# Altium footprint library lib_eps.PcbLib: 113 footprints (part 6 of 8)
Each footprint in its own frame and in the unit in brackets; x right, y up, seen from the top. Pads: shape width x height; smd on the part's side, far side on the other; paste and mask are expansions set on the pad; w line width, h text height; cw(c..) or ccw(c..) is an arc to the next point about the centre after c.
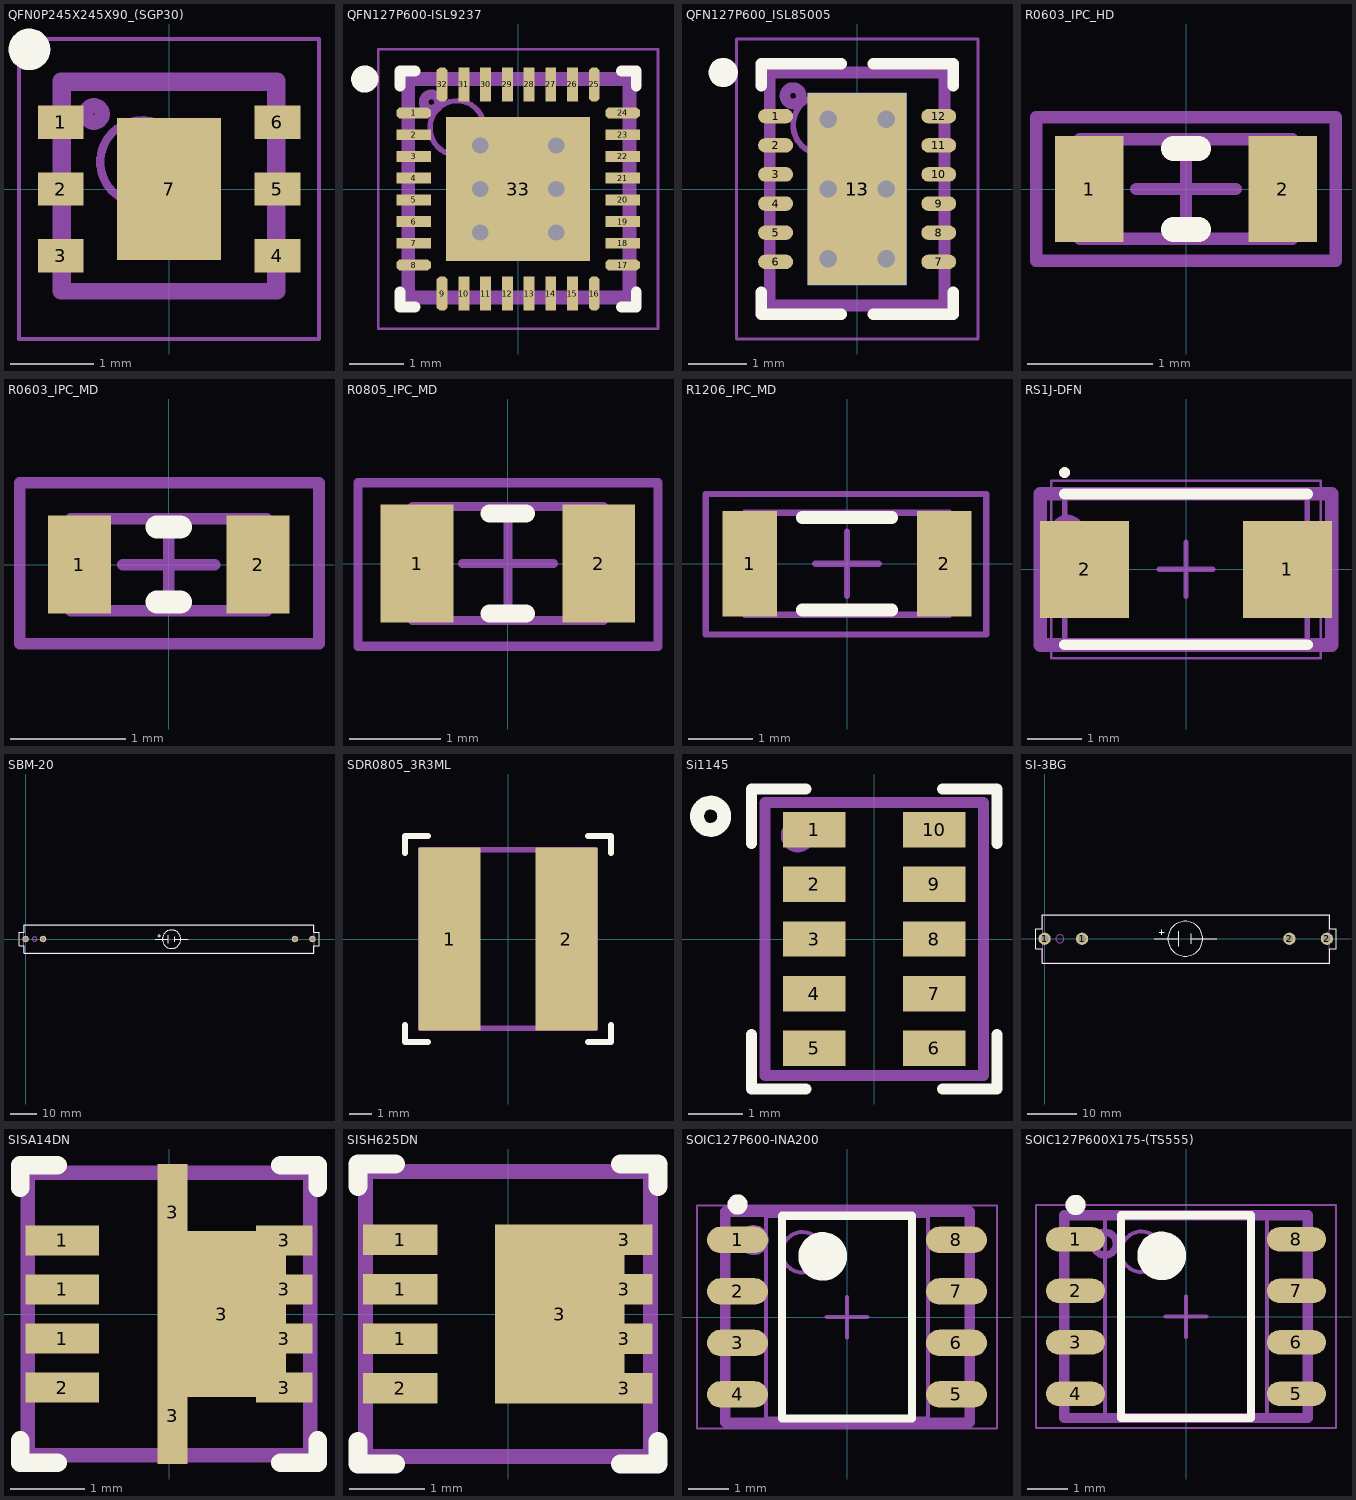
[diagram p5: the footprints below, top view; thin cyan lines are the x and y axes]

## QFN0P245X245X90_(SGP30) [mm] "QFN, 6-Leads, Body 2,45x2,45mm, Pitch 0,00mm/0,80mm, Thermal Pad 1,25x1,70mm, IPC Medium Density"
height 0.9
pads (7):
  rect 0.55x0.4 smd: 1(-1.3,0.8) 2(-1.3,0) 3(-1.3,-0.8) 4(1.3,-0.8) 5(1.3,0) 6(1.3,0.8)
  rect 1.25x1.7 smd: 7(0,0)
Top Overlay:
  circle w0.25: c-1.675,1.675 r0.125
Mechanical 13:
  circle w0.1: c-0.325,0.325 r0.5
  lines w0.1: -1.225,-1.225 -1.225,1.225 1.225,1.225 1.225,-1.225 -1.225,-1.225
Mechanical 15:
  lines w0.05: -1.8,-1.8 -1.8,1.8 1.8,1.8 1.8,-1.8 -1.8,-1.8
  lines w0.1: -0.5,0 0.5,0 ; 0,-0.5 0,0.5
Mechanical 29:
  circle w0.18: c-0.9,0.9 r0.1
  lines w0.2: -1.3,-1.225 -1.3,1.3 1.3,1.3 1.3,-1.225 -1.3,-1.225
  text "'.Designator'" at -0.9,-0.2 h0.6
3D body "QFN0P245X245X90_(SGP30).step": height 0.9, standoff 0, extent -1.235,-1.225 1.235,1.225

## QFN127P600-ISL9237 [mm]
height 0.9
pads (33):
  oct 0.63x0.2 smd mask+0.051: 1(-1.925,1.4) 8(-1.925,-1.4) 17(1.925,-1.4) 24(1.925,1.4)
  rect 0.63x0.2 smd mask+0.051: 2(-1.925,1) 3(-1.925,0.6) 4(-1.925,0.2) 5(-1.925,-0.2) 6(-1.925,-0.6) 7(-1.925,-1) 18(1.925,-1) 19(1.925,-0.6) 20(1.925,-0.2) 21(1.925,0.2) 22(1.925,0.6) 23(1.925,1)
  oct 0.2x0.63 smd mask+0.051: 9(-1.4,-1.925) 16(1.4,-1.925) 25(1.4,1.925) 32(-1.4,1.925)
  rect 0.2x0.63 smd mask+0.051: 10(-1,-1.925) 11(-0.6,-1.925) 12(-0.2,-1.925) 13(0.2,-1.925) 14(0.6,-1.925) 15(1,-1.925) 26(1,1.925) 27(0.6,1.925) 28(0.2,1.925) 29(-0.2,1.925) 30(-0.6,1.925) 31(-1,1.925)
  rect 2.65x2.65 smd mask+0.051: 33(0,0)
via 0.7,-0.8 diameter 0.605 hole 0.3
via -0.7,-0.8 diameter 0.605 hole 0.3
via 0.7,0 diameter 0.605 hole 0.3
via -0.7,0 diameter 0.605 hole 0.3
via 0.7,0.8 diameter 0.605 hole 0.3
via -0.7,0.8 diameter 0.605 hole 0.3
Top Overlay:
  circle w0.25: c-2.825,2.025 r0.125
  lines w0.2: -2.175,-1.9 -2.175,-2.175 -1.9,-2.175 ; -2.175,1.9 -2.175,2.175 -1.9,2.175 ; 1.9,-2.175 2.175,-2.175 2.175,-1.9 ; 1.9,2.175 2.175,2.175 2.175,1.9
Mechanical 13:
  circle w0.1: c-1.125,1.125 r0.5
  lines w0.1: -2.025,-2.025 -2.025,2.025 2.025,2.025 2.025,-2.025 -2.025,-2.025
Mechanical 15:
  lines w0.05: -2.575,-2.575 -2.575,2.575 2.575,2.575 2.575,-2.575 -2.575,-2.575
  lines w0.1: -0.5,0 0.5,0 ; 0,-0.5 0,0.5
Mechanical 29:
  circle w0.18: c-1.6,1.6 r0.141
  lines w0.254: -2.025,-2 -2.025,2.025 2.05,2.025 2.05,-2 -2.025,-2
  text "'.Designator'" at -1.5,-0.2 h0.6
3D body "QFN127P600-ISL9237.step": height 0.9, standoff 0, extent -2.075,-2.075 2.075,2.075

## QFN127P600_ISL85005 [mm]
height 0.9
pads (14):
  oval 0.6x0.25 smd mask+0.051: 1(-1.4,1.25) 2(-1.4,0.75) 3(-1.4,0.25) 4(-1.4,-0.25) 5(-1.4,-0.75) 6(-1.4,-1.25) 7(1.4,-1.25) 8(1.4,-0.75) 9(1.4,-0.25) 10(1.4,0.25) 11(1.4,0.75) 12(1.4,1.25)
  rect 1.7x3.3 smd mask+0.051: 13(0,0)
  rect 1.7x3.3 smd far side: 13(0,0)
via 0.5,-1.2 diameter 0.605 hole 0.3
via -0.5,-1.2 diameter 0.605 hole 0.3
via -0.5,0 diameter 0.605 hole 0.3
via 0.5,1.2 diameter 0.605 hole 0.3
via -0.5,1.2 diameter 0.605 hole 0.3
via 0.5,0 diameter 0.605 hole 0.3
Top Overlay:
  circle w0.25: c-2.3,2 r0.125
  lines w0.2: -1.65,-1.775 -1.65,-2.15 -0.275,-2.15 ; -1.65,1.775 -1.65,2.15 -0.275,2.15 ; 0.275,-2.15 1.65,-2.15 1.65,-1.775 ; 0.275,2.15 1.65,2.15 1.65,1.775
Mechanical 13:
  circle w0.1: c-0.6,1.1 r0.5
  lines w0.1: -1.5,-2 -1.5,2 1.5,2 1.5,-2 -1.5,-2
Mechanical 15:
  lines w0.05: -2.075,-2.575 -2.075,2.575 2.075,2.575 2.075,-2.575 -2.075,-2.575
  lines w0.1: -0.5,0 0.5,0 ; 0,-0.5 0,0.5
Mechanical 29:
  circle w0.18: c-1.1,1.6 r0.141
  lines w0.2: -1.5,-2 1.5,-2 1.5,2 -1.5,2 -1.5,-2
  text "'.Designator'" at -1,-0.3 h0.6
3D body "QFN127P600-8N.step": height 0.9, standoff 0, extent -1.55,-2 1.55,2

## R0603_IPC_HD [mm] "Chip Resistor, 2-Leads, Body 1,60x0,80mm, IPC Medium Density"
height 0.45
pads (2):
  rect 0.55x0.85 smd: 1(-0.775,0) 2(0.775,0)
Top Overlay:
  lines w0.2: -0.1,-0.325 0.1,-0.325 ; -0.1,0.325 0.1,0.325
Mechanical 13:
  lines w0.1: -0.85,-0.4 -0.85,0.4 0.85,0.4 0.85,-0.4 -0.85,-0.4
Mechanical 15:
  lines w0.05: -1.175,-0.55 -1.175,0.55 -1.15,0.55 1.175,0.55 1.175,-0.55 -1.175,-0.55
  lines w0.1: -0.4,0 0.4,0 ; 0,-0.4 0,0.4
Mechanical 29:
  lines w0.1: -1.2,-0.575 1.2,-0.575 1.2,0.575 -1.2,0.575 -1.2,-0.575
  text ".Designator" at -1.092,-0.254 h0.6
3D body "R0603_IPC_MD2.step": height 0.45, standoff 0, extent -0.85,-0.4 0.85,0.4

## R0603_IPC_MD [mm] "Chip Resistor, 2-Leads, Body 1,60x0,80mm, IPC Medium Density"
height 0.45
pads (2):
  rect 0.55x0.85 smd: 1(-0.775,0) 2(0.775,0)
Top Overlay:
  lines w0.2: -0.1,-0.325 0.1,-0.325 ; -0.1,0.325 0.1,0.325
Mechanical 13:
  lines w0.1: -0.85,-0.4 0.85,-0.4 0.85,0.4 -0.85,0.4 -0.85,-0.4
Mechanical 15:
  lines w0.05: -1.3,-0.7 1.3,-0.7 1.3,0.7 -1.3,0.7 -1.3,-0.7
  lines w0.1: -0.4,0 0.4,0 ; 0,-0.4 0,0.4
Mechanical 29:
  lines w0.1: -1.295,-0.689 -1.295,0.711 1.305,0.711 1.305,-0.689 -1.295,-0.689
  text ".Designator" at -1.092,-0.254 h0.6
3D body "R0603_IPC_MD2.step": height 0.45, standoff 0, extent -0.85,-0.4 0.85,0.4

## R0805_IPC_MD [mm] "Chip Resistor, 2-Leads, Body 2,00x1,25mm, IPC Medium Density"
height 0.5
pads (2):
  rect 0.8x1.3 smd: 1(-1,0) 2(1,0)
Top Overlay:
  lines w0.2: -0.2,-0.55 0.2,-0.55 ; -0.2,0.55 0.2,0.55
Mechanical 13:
  lines w0.1: -1.05,-0.625 1.05,-0.625 1.05,0.625 -1.05,0.625 -1.05,-0.625
Mechanical 15:
  lines w0.05: -1.65,-0.9 1.65,-0.9 1.65,0.9 -1.65,0.9 -1.65,-0.9
  lines w0.1: -0.5,0 0.5,0 ; 0,-0.5 0,0.5
Mechanical 29:
  lines w0.1: -1.649,-0.911 -1.649,0.889 1.651,0.889 1.651,-0.911 -1.649,-0.911
  text ".Designator" at -1.448,-0.381 h0.7
3D body "R0805_IPC_MD2.step": height 0.5, standoff 0, extent -1.05,-0.625 1.05,0.625

## R1206_IPC_MD [mm] "Chip Resistor, 2-Leads, Body 3,10x1,60mm, IPC Medium Density"
height 0.55
pads (2):
  rect 0.85x1.65 smd: 1(-1.525,0) 2(1.525,0)
Top Overlay:
  lines w0.2: -0.7,-0.725 0.7,-0.725 ; -0.7,0.725 0.7,0.725
Mechanical 13:
  lines w0.1: -1.6,-0.8 1.6,-0.8 1.6,0.8 -1.6,0.8 -1.6,-0.8
Mechanical 15:
  lines w0.05: -2.2,-1.1 2.2,-1.1 2.2,1.1 -2.2,1.1 -2.2,-1.1
  lines w0.1: -0.5,0 0.5,0 ; 0,-0.5 0,0.5
Mechanical 29:
  lines w0.1: -2.216,-1.108 -2.216,1.092 2.184,1.092 2.184,-1.108 -2.216,-1.108
  text ".Designator" at -1.854,-0.381 h0.8
3D body "R1206_IPC_MD.step": height 0.55, standoff 0, extent -1.6,-0.8 1.6,0.8

## RS1J-DFN [mm] "DFN, 2-Leads, Body 2,67x4,25mm, Pitch 3,76mm, IPC Medium Density"
height 2.29
pads (2):
  rect 1.65x1.8 smd: 1(1.88,0) 2(-1.88,0)
Top Overlay:
  circle w0.1: c-2.25,1.795 r0.05
  lines w0.2: -2.25,-1.395 2.25,-1.395 ; -2.25,1.395 2.25,1.395
Mechanical 13:
  lines w0.1: -2.25,-1.395 -2.25,1.395 2.25,1.395 2.25,-1.395 -2.25,-1.395
Mechanical 15:
  lines w0.05: -2.5,-1.645 -2.5,1.645 2.5,1.645 2.5,-1.645 -2.5,-1.645
  lines w0.1: -0.5,0 0.5,0 ; 0,-0.5 0,0.5
Mechanical 29:
  circle w0.18: c-2.2,0.7 r0.224
  lines w0.254: -2.7,-1.4 2.7,-1.4 2.7,1.4 -2.7,1.4 -2.7,-1.4
  text "'.Designator'" at -2,-0.2 h0.6
3D body "RS1J-DFN.step": height 2.29, standoff 0, extent -2.64,-1.395 2.64,1.395

## SBM-20 [mm] "Geiger tube 400V"
pads (4):
  round 2.5 hole 1.5: 1(0,0) 1(6.731,0) 2(103.269,0) 2(110,0)
Top Overlay:
  circle w0.254: c56,-0.1 r3.538
  lines w0.25: 49.7,-0.1 54.7,-0.1 54.7,1.4 54.7,-1.6 ; 51.25,0.75 51.25,1.75 51.25,1.25 50.75,1.25 51.75,1.25 ; 57.2,-1.1 57.2,0.9 ; 57.2,-0.1 62.4,-0.1 ; -2.5,-2.5 -0.5,-2.5 -0.5,-5.5 110.5,-5.5 110.5,-2.5 112.5,-2.5 112.5,2 112.5,2.5 110.5,2.5 110.5,5.5 -0.5,5.5 -0.5,2.5 -2.5,2.5 -2.5,-2.5
Mechanical 29:
  circle w0.18: c3.5,0 r0.86
  lines w0.254: -0.6,2.1 -0.6,5.3 -0.5,5.3 110.6,5.3 110.6,-5.3 -0.6,-5.3 -0.6,2.3
  text "'.Designator'" at 29,-1 h1.52
3D body "spm20.stp": height 15.42, standoff -1.09, extent -0.5,-5.323 110.549,5.323

## SDR0805_3R3ML [mm] "3.3µH Unshielded Wirewound Inductor 4.5A 20 mOhm Max Nonstandard"
pads (2):
  rect 2.7x8 smd: 1(-2.55,0) 2(2.55,0)
Top Overlay:
  lines w0.254: -4.5,-3.75 -4.5,-4.5 -3.5,-4.5 ; -4.5,3.75 -4.5,4.5 -3.5,4.5 ; 3.5,-4.5 4.5,-4.5 4.5,-3.75 ; 3.5,4.5 4.5,4.5 4.5,3.75
Mechanical 29:
  lines w0.254: -3.8,-3.9 0,-3.9 3.8,-3.9 3.8,3.9 -3.8,3.9 -3.8,-3.9
  text "'.Designator'" at -2.1,-0.2 h0.6
3D body "sdr0805.stp": height 5.3, standoff 0, extent -3.9,-3.9 3.9,3.9

## Si1145 [mm] "Optical Sensor Ambient, IR, Ultraviolet (UV) 850nm I?C 10-SMD Module, No Lead"
height 1.2
pads (10):
  rect 1.15x0.65 smd: 1(-1.1,2) 2(-1.1,1) 3(-1.1,0) 4(-1.1,-1) 5(-1.1,-2) 6(1.1,-2) 7(1.1,-1) 8(1.1,0) 9(1.1,1) 10(1.1,2)
Top Overlay:
  circle w0.254: c-3,2.25 r0.25
  lines w0.2: -2.25,-1.75 -2.25,-2.75 -1.25,-2.75 ; -1.25,2.75 -2.25,2.75 ; 1.25,-2.75 2.25,-2.75 2.25,-1.75 ; 1.25,2.75 2.25,2.75 2.25,1.75 ; -2.25,2.75 -2.25,1.75 -2.25,2.75
Mechanical 29:
  circle w0.18: c-1.4,1.9 r0.224
  lines w0.2: -2,-2.5 -2,2.5 2,2.5 2,-2.5 -2,-2.5
  text "'.Designator'" at -1.6,-0.1 h0.6
3D body "UV, Ambient Light Sensor.step": height 1.3, standoff -0.01, extent -2,-2.5 2,2.5

## SI-3BG [mm] "Geiger tube 400V"
pads (4):
  round 2.5 hole 1.5: 1(0,0) 1(7.62,0) 2(49.78,0) 2(57.4,0)
Top Overlay:
  circle w0.254: c28.6,0 r3.538
  lines w0.25: 22.3,0 27.3,0 27.3,1.5 27.3,-1.5 ; 23.85,0.85 23.85,1.85 23.85,1.35 23.35,1.35 24.35,1.35 ; 29.8,-1 29.8,1 ; 29.8,0 35,0
  lines w0.254: -1.75,-2 -1.75,2 -0.5,2 -0.5,4.9 58,4.9 58,2 59.25,2 59.25,-2 58,-2 58,-5 -0.5,-5 -0.5,-2 -1.75,-2
Mechanical 29:
  lines w0.18: 3.9,0.1 ccw(c3.1,0) 3.906,0
  lines w0.254: -0.4,-4.9 -0.4,4.8 57.9,4.8 57.9,-4.9 -0.4,-4.9
  text "'.Designator'" at 9.5,-0.7 h1.52
3D body "Сборка2.stp": height 13.26, standoff -2.75, extent -0.358,-4.913 57.847,4.761

## SISA14DN [mm] "PowerPAK® 1212-8  N-Channel 30V 20A"
pads (11):
  rect 0.99x0.405 smd mask+0.051: 1(-1.435,-0.33) 1(-1.435,0.33) 1(-1.435,0.99) 2(-1.435,-0.99)
  rect 0.4x1.3 smd mask+0.051: 3(0.047,1.368) 3(0.048,-1.368)
  rect 1.725x2.235 smd mask+0.051: 3(0.71,0)
  rect 0.76x0.405 smd mask+0.051: 3(1.55,-0.99) 3(1.55,-0.33) 3(1.55,0.33) 3(1.55,0.99)
Top Overlay:
  lines w0.25: -2,1.7 -2,2
  lines w0.254: -2,-1.7 -2,-2 -1.5,-2 ; -2,2 -1.75,2 -1.5,2 ; 1.5,-2 2,-2 2,-1.7 ; 1.5,2 2,2 2,1.7
Mechanical 29:
  lines w0.2: -1.9,-1.9 1.9,-1.9 1.9,1.9 -1.9,1.9 -1.9,-1.9
  text "'.Designator'" at -1.6,-0.2 h0.6
3D body "PowerPAK 1212-8 Single Pad.step": height 1.05, standoff 0.01, extent -1.775,-1.775 1.775,1.775

## SISH625DN [mm] "Mount PowerPAK® 1212-8SH P-Channel 30V 17.3A"
pads (9):
  rect 0.99x0.405 smd mask+0.051: 1(-1.435,-0.33) 1(-1.435,0.33) 1(-1.435,0.99) 2(-1.435,-0.99)
  rect 1.725x2.39 smd mask+0.051: 3(0.69,0)
  rect 0.76x0.405 smd mask+0.051: 3(1.55,-0.99) 3(1.55,-0.33) 3(1.55,0.33) 3(1.55,0.99)
Top Overlay:
  lines w0.254: -2,-1.7 -2,-2 -1.5,-2 ; -2,1.7 -2,2 -1.5,2 ; 1.5,-2 2,-2 2,-1.7 ; 1.5,2 2,2 2,1.7
Mechanical 29:
  lines w0.2: -1.9,-1.9 -1.9,1.9 1.9,1.9 1.9,-1.9 -1.9,-1.9
  text "'.Designator'" at -1.3,-0.2 h0.6
3D body "PowerPAK 1212-8 Single Pad.step": height 1.05, standoff 0.01, extent -1.775,-1.775 1.775,1.775

## SOIC127P600-INA200 [mm]
height 1.75
pads (8):
  oval 1.5x0.65 smd: 1(-2.7,1.905) 2(-2.7,0.635) 3(-2.7,-0.635) 4(-2.7,-1.905) 5(2.7,-1.905) 6(2.7,-0.635) 7(2.7,0.635) 8(2.7,1.905)
Top Overlay:
  circle w0.6: c-0.6,1.5 r0.3
  circle w0.25: c-2.7,2.78 r0.125
  lines w0.2: -1.6,-2.5 1.6,-2.5 1.6,2.5 -1.6,2.5 -1.6,-2.5
Mechanical 13:
  circle w0.1: c-1.1,1.6 r0.5
  lines w0.1: -2,-2.5 2,-2.5 2,2.5 -2,2.5 -2,-2.5
Mechanical 15:
  lines w0.05: -3.7,-2.75 3.7,-2.75 3.7,2.75 -3.7,2.75 -3.7,-2.75
  lines w0.1: -0.5,0 0.5,0 ; 0,-0.5 0,0.5
Mechanical 29:
  circle w0.18: c-2.3,1.9 r0.283
  lines w0.254: -3,-2.6 3.025,-2.6 3.025,2.6 -3,2.6 -3,-2.6
  text "'.Designator'" at -2.1,-0.4 h1
3D body "SOIC127P600-INA200.step": height 1.75, standoff 0, extent -3,-2.5 3,2.5

## SOIC127P600X175-(TS555) [mm] "SOIC, 8-Leads, Body 4,90x3,90mm, Pitch 1,27mm, IPC Medium Density"
height 1.75
pads (8):
  oval 1.45x0.6 smd: 1(-2.725,1.905) 2(-2.725,0.635) 3(-2.725,-0.635) 4(-2.725,-1.905) 5(2.725,-1.905) 6(2.725,-0.635) 7(2.725,0.635) 8(2.725,1.905)
Top Overlay:
  circle w0.25: c-2.725,2.755 r0.125
  circle w0.6: c-0.6,1.5 r0.3
  lines w0.2: -1.6,-2.5 -1.6,2.5 1.6,2.5 1.6,-2.5 -1.6,-2.5
Mechanical 13:
  circle w0.1: c-1.1,1.6 r0.5
  lines w0.1: -2,-2.5 -2,2.5 2,2.5 2,-2.5 -2,-2.5
Mechanical 15:
  lines w0.05: -3.7,-2.75 -3.7,2.75 3.7,2.75 3.7,-2.75 -3.7,-2.75
  lines w0.1: -0.5,0 0.5,0 ; 0,-0.5 0,0.5
Mechanical 29:
  circle w0.18: c-2,1.8 r0.283
  lines w0.254: -3,-2.5 -3,2.5 3,2.5 3,-2.5 -3,-2.5
  text "'.Designator'" at -2.1,-0.4 h1
3D body "SOIC127P600X175-(TS555).step": height 1.75, standoff 0, extent -3,-2.5 3,2.5